# Altium footprint library PcbLib1.PcbLib: 48 footprints (part 2 of 3)
Each footprint in its own frame and in the unit in brackets; x right, y up, seen from the top. Pads: shape width x height; smd on the part's side, far side on the other; paste and mask are expansions set on the pad; w line width, h text height; cw(c..) or ccw(c..) is an arc to the next point about the centre after c.
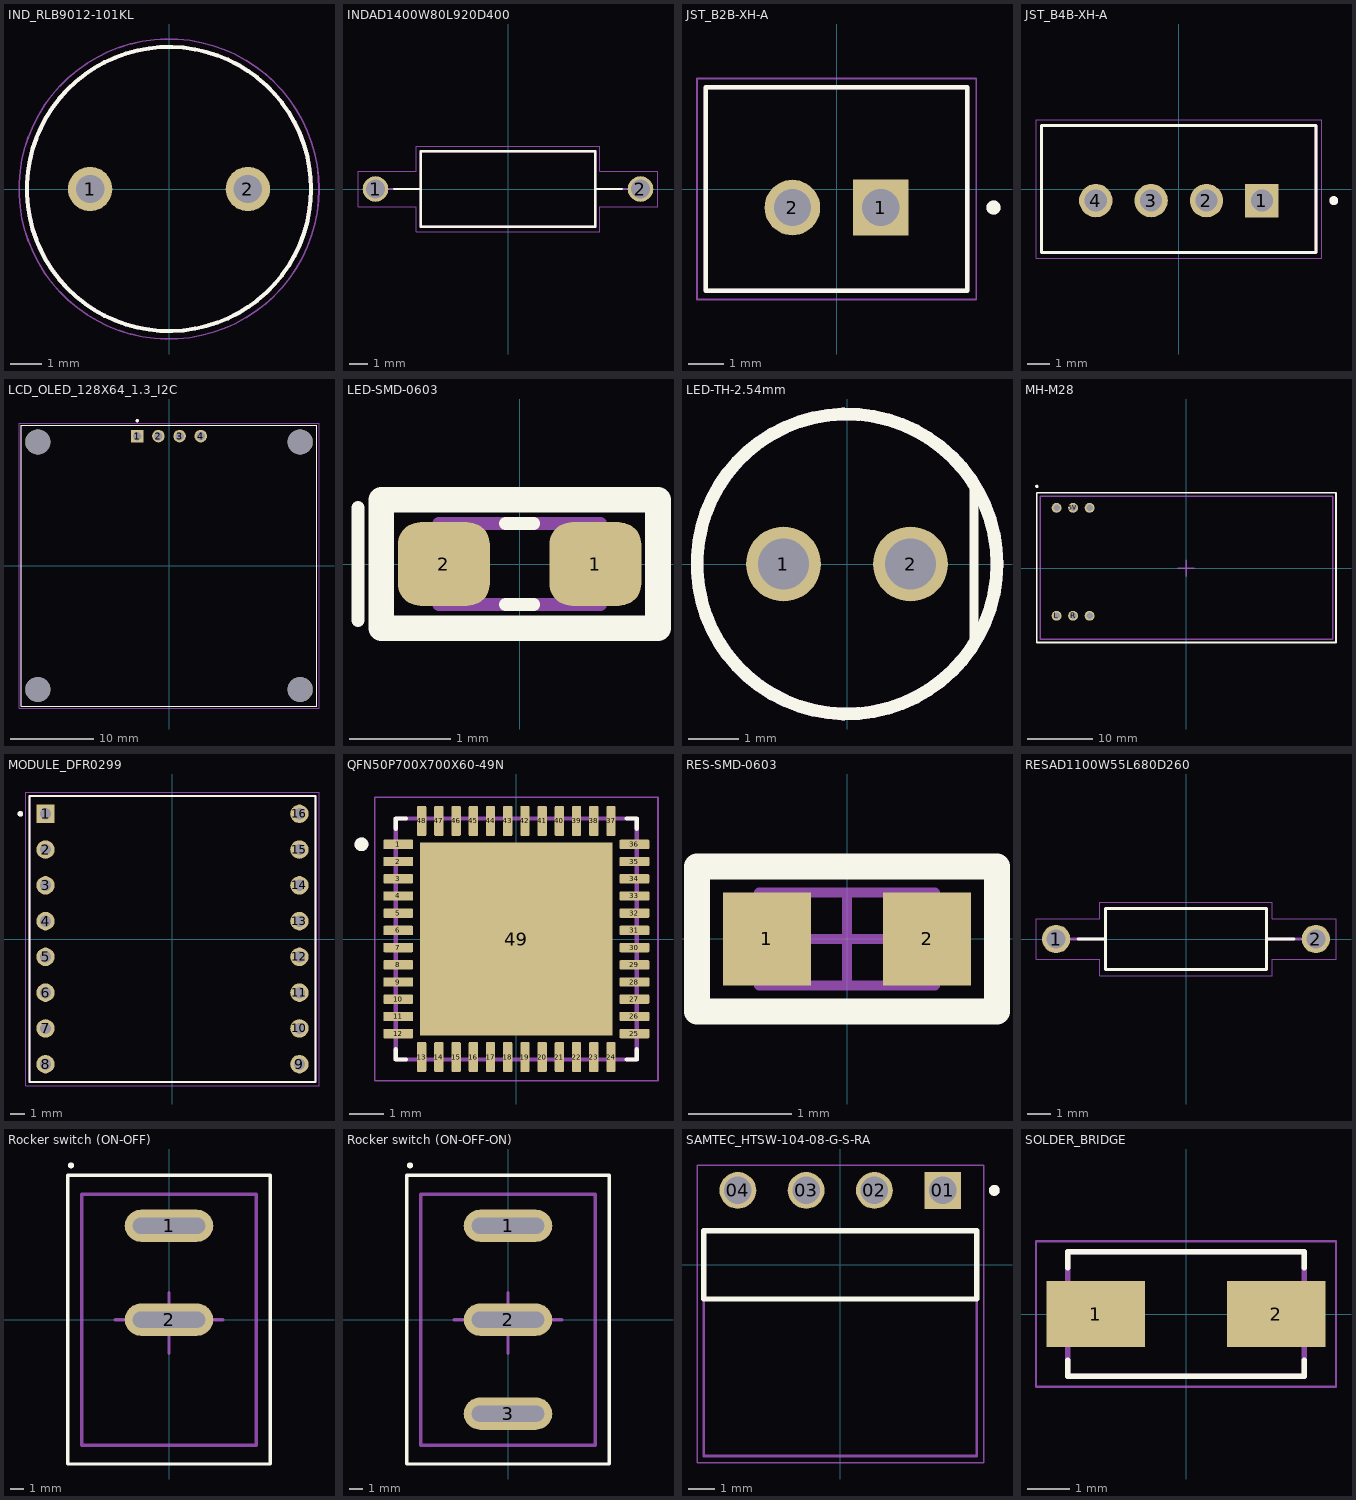
[diagram p1: the footprints below, top view; thin cyan lines are the x and y axes]

## IND_RLB9012-101KL [mm]
height 12.2
pads (2):
  round 1.408 hole 0.9: 1(-2.5,0) 2(2.5,0)
Top Overlay:
  circle w0.127: c0,0 r4.5
Mechanical 13:
  circle w0.127: c0,0 r4.5
Mechanical 15:
  circle w0.05: c0,0 r4.75
3D body "step_temp.STEP": height 12.2, standoff -30, extent -4.5,-4.5 4.5,4.5

## INDAD1400W80L920D400 [mm]
height 4
pads (2):
  round 1.35 hole 1: 1(-7,0) 2(7,0)
Top Overlay:
  lines w0.127: -6.005,0 -4.6,0 ; 4.6,0 6.005,0 ; -4.6,-2 4.6,-2 4.6,2 -4.6,2 -4.6,-2
Mechanical 13:
  lines w0.127: -7,0 -4.6,0 ; 4.6,0 7,0 ; -4.6,-2 -4.6,2 4.6,2 4.6,-2 -4.6,-2
Mechanical 15:
  lines w0.05: -7.925,-0.925 -7.925,0.925 -4.85,0.925 -4.85,2.25 4.85,2.25 4.85,0.925 7.925,0.925 7.925,-0.925 4.85,-0.925 4.85,-2.25 -4.85,-2.25 -4.85,-0.925 -7.925,-0.925
3D body "step_temp.STEP": height 4, standoff -21, extent -7.4,-2 7.4,2

## JST_B2B-XH-A [mm]
height 7
pads (2):
  rect 1.575x1.575 / inner round 1.575 / far side rect 1.575x1.575 hole 1.05: 1(1.25,-0.525)
  round 1.575 hole 1.05: 2(-1.25,-0.525)
Top Overlay:
  circle w0.2: c4.44,-0.525 r0.1
  lines w0.127: -3.7,-2.875 3.7,-2.875 3.7,2.875 -3.7,2.875 -3.7,-2.875
Mechanical 13:
  circle w0.2: c4.44,-0.525 r0.1
  lines w0.127: -3.7,-2.875 3.7,-2.875 3.7,2.875 -3.7,2.875 -3.7,-2.875
Mechanical 15:
  lines w0.05: -3.95,-3.125 -3.95,3.125 3.95,3.125 3.95,-3.125 -3.95,-3.125
3D body "B2B-XH-A--3DModel-STEP-56544.STEP": height 7, standoff -3.4, extent -3.717,-2.875 3.683,2.875

## JST_B4B-XH-A [mm]
height 7
pads (4):
  rect 1.508x1.508 / inner round 1.508 / far side rect 1.508x1.508 hole 1: 1(3.75,-0.525)
  round 1.508 hole 1: 2(1.25,-0.525) 3(-1.25,-0.525) 4(-3.75,-0.525)
Top Overlay:
  circle w0.2: c7,-0.525 r0.1
  lines w0.127: -6.2,-2.875 6.2,-2.875 6.2,2.875 -6.2,2.875 -6.2,-2.875
Mechanical 13:
  circle w0.2: c7,-0.525 r0.1
  lines w0.127: -6.2,-2.875 6.2,-2.875 6.2,2.875 -6.2,2.875 -6.2,-2.875
Mechanical 15:
  lines w0.05: -6.45,-3.125 6.45,-3.125 6.45,3.125 -6.45,3.125 -6.45,-3.125
3D body "step_temp.STEP": height 7, standoff -3.4, extent -6.2,-2.875 6.2,2.875

## LCD_OLED_128X64_1.3_I2C [mm]
pads (8):
  rect 1.508x1.508 / inner round 1.508 / far side rect 1.508x1.508 hole 1: 1(-3.81,15.55)
  round 1.508 hole 1: 2(-1.27,15.55) 3(1.27,15.55) 4(3.81,15.55)
  round 3 hole 3 unplated: ""(-15.75,-14.85) ""(-15.75,14.85) ""(15.75,-14.85) ""(15.75,14.85)
Top Overlay:
  circle w0.2: c-3.81,17.4 r0.1
  lines w0.127: -17.75,-16.85 -17.75,16.85 17.75,16.85 17.75,-16.85 -17.75,-16.85
Mechanical 13:
  circle w0.2: c-3.81,17.4 r0.1
  lines w0.127: -17.75,-16.85 -17.75,16.85 17.75,16.85 17.75,-16.85 -17.75,-16.85
Mechanical 15:
  lines w0.05: -18,-17.1 18,-17.1 18,17.1 -18,17.1 -18,-17.1
3D body "PCB v8.step": height 2, standoff -15.14, extent -17.747,-16.623 17.653,16.877

## LED-SMD-0603 [mm]
pads (2):
  rrect53% 0.91x0.83 smd: 1(0.75,0) 2(-0.75,0)
Top Overlay:
  lines w0.127: -1.6,-0.559 -1.6,0.559 ; -0.14,-0.4 0.14,-0.4 ; -0.14,0.4 0.14,0.4
  lines w0.254: -1.37,-0.635 1.37,-0.635 1.37,0.635 -1.37,0.635 -1.37,-0.635
Mechanical 13:
  lines w0.127: -0.8,-0.4 -0.8,0.4 0.8,0.4 0.8,-0.4 -0.8,-0.4
Mechanical 15:
  lines w0.05: -1.37,-0.67 -1.37,0.67 1.37,0.67 1.37,-0.67 -1.37,-0.67
3D body "step_temp.STEP": height 0.7, standoff 0, extent -0.8,-0.4 0.8,0.4

## LED-TH-2.54mm [mm]
pads (2):
  round 1.5 hole 1.02: 1(-1.27,0) 2(1.27,0)
Top Overlay:
  circle w0.254: c0,0 r3
  lines w0.178: 2.541,-1.595 2.541,1.608
Top Courtyard:
  circle w0.254: c0,0 r3
3D body "LED, 5mm, red v4.step": height 8.9, standoff -28, extent -2.938,-2.948 2.563,2.948

## MH-M28 [mm]
pads (6):
  round 1.524 hole 1: 5V(-17.42,9.3) AGND(-14.88,-7.3) GND(-19.96,9.3) L(-19.96,-7.3) R(-17.42,-7.3) VBAT(-14.88,9.3)
Top Overlay:
  circle w0.254: c-23,12.6 r0.127
  lines w0.254: -23,-11.4 23,-11.4 23,11.6 -23,11.6 -23,-11.4
Top Assembly:
  lines w0.254: -22.5,-10.9 -22.5,11.1 22.5,11.1 22.5,-10.9 -22.5,-10.9
Top Courtyard:
  lines w0.254: -1.3,0 1.2,0 ; 0,-1.2 0,1.2
3D body "mh-m28.STEP": height 5.96, standoff 0, extent -22.5,-11 22.5,11

## MODULE_DFR0299 [mm]
pads (16):
  rect 1.308x1.308 / inner round 1.308 / far side rect 1.308x1.308 hole 0.8: 1(-9.017,8.89)
  round 1.308 hole 0.8: 2(-9.017,6.35) 3(-9.017,3.81) 4(-9.017,1.27) 5(-9.017,-1.27) 6(-9.017,-3.81) 7(-9.017,-6.35) 8(-9.017,-8.89) 9(9.017,-8.89) 10(9.017,-6.35) 11(9.017,-3.81) 12(9.017,-1.27) 13(9.017,1.27) 14(9.017,3.81) 15(9.017,6.35) 16(9.017,8.89)
Top Overlay:
  circle w0.2: c-10.8,8.89 r0.1
  lines w0.127: -10.16,-10.16 10.16,-10.16 10.16,10.16 -10.16,10.16 -10.16,-10.16
Mechanical 13:
  circle w0.2: c-10.8,8.89 r0.1
  lines w0.127: -10.16,-10.16 -10.16,10.16 10.16,10.16 10.16,-10.16 -10.16,-10.16
Mechanical 15:
  lines w0.05: -10.41,-10.41 -10.41,10.41 10.41,10.41 10.41,-10.41 -10.41,-10.41
3D body "step_temp.STEP": height 6.25, standoff -5.5, extent -10.16,-10.16 10.16,10.16

## QFN50P700X700X60-49N [mm]
pads (49):
  rrect25% 0.87x0.27 smd: 1(-3.43,2.75) 2(-3.43,2.25) 3(-3.43,1.75) 4(-3.43,1.25) 5(-3.43,0.75) 6(-3.43,0.25) 7(-3.43,-0.25) 8(-3.43,-0.75) 9(-3.43,-1.25) 10(-3.43,-1.75) 11(-3.43,-2.25) 12(-3.43,-2.75) 25(3.43,-2.75) 26(3.43,-2.25) 27(3.43,-1.75) 28(3.43,-1.25) 29(3.43,-0.75) 30(3.43,-0.25) 31(3.43,0.25) 32(3.43,0.75) 33(3.43,1.25) 34(3.43,1.75) 35(3.43,2.25) 36(3.43,2.75)
  rrect25% 0.27x0.87 smd: 13(-2.75,-3.43) 14(-2.25,-3.43) 15(-1.75,-3.43) 16(-1.25,-3.43) 17(-0.75,-3.43) 18(-0.25,-3.43) 19(0.25,-3.43) 20(0.75,-3.43) 21(1.25,-3.43) 22(1.75,-3.43) 23(2.25,-3.43) 24(2.75,-3.43) 37(2.75,3.43) 38(2.25,3.43) 39(1.75,3.43) 40(1.25,3.43) 41(0.75,3.43) 42(0.25,3.43) 43(-0.25,3.43) 44(-0.75,3.43) 45(-1.25,3.43) 46(-1.75,3.43) 47(-2.25,3.43) 48(-2.75,3.43)
  rect 5.6x5.6 smd paste-4: 49(0,0)
Top Overlay:
  circle w0.2: c-4.5,2.75 r0.1
  lines w0.127: -3.5,-3.205 -3.5,-3.5 -3.205,-3.5 ; -3.5,3.205 -3.5,3.5 -3.205,3.5 ; 3.205,-3.5 3.5,-3.5 3.5,-3.205 ; 3.205,3.5 3.5,3.5 3.5,3.205
Top Paste:
  region: -0.51,0.51 -2.29,0.51 -2.29,2.29 -0.51,2.29
  region: 2.29,0.51 0.51,0.51 0.51,2.29 2.29,2.29
  region: -0.51,-2.29 -2.29,-2.29 -2.29,-0.51 -0.51,-0.51
  region: 2.29,-2.29 0.51,-2.29 0.51,-0.51 2.29,-0.51
Mechanical 13:
  circle w0.2: c-4.5,2.75 r0.1
  lines w0.127: -3.5,-3.5 3.5,-3.5 3.5,3.5 -3.5,3.5 -3.5,-3.5
Mechanical 15:
  lines w0.05: -4.115,-4.115 4.115,-4.115 4.115,4.115 -4.115,4.115 -4.115,-4.115
3D body "STM32F411CEU6--3DModel-STEP-56544.STEP": height 0.6, standoff 0, extent -3.5,-3.5 3.5,3.5

## RES-SMD-0603 [mm] "Chip Resistor, 2-Leads, Body 1.60x0.80mm, IPC Medium Density"
height 0.55
pads (2):
  rect 0.85x0.9 smd: 1(-0.775,0) 2(0.775,0)
Top Overlay:
  lines w0.254: -1.45,-0.7 1.45,-0.7 1.45,0.7 -1.45,0.7 -1.45,-0.7
Top Assembly:
  lines w0.1: -0.85,-0.45 -0.85,0.45 0.85,0.45 0.85,-0.45 -0.85,-0.45
Top Courtyard:
  lines w0.05: -1.45,-0.7 -1.45,0.7 1.45,0.7 1.45,-0.7 -1.45,-0.7
  lines w0.1: -0.45,0 0.45,0 ; 0,-0.45 0,0.45
3D body "RESC1608X06N.step": height 0.55, standoff 0, extent -0.85,-0.45 0.85,0.45

## RESAD1100W55L680D260 [mm]
height 2.6
pads (2):
  round 1.2 hole 0.8: 1(-5.5,0) 2(5.5,0)
Top Overlay:
  lines w0.127: -4.58,0 -3.4,0 ; 4.58,0 3.4,0 ; -3.4,0 -3.4,1.3 3.4,1.3 3.4,0 ; -3.4,0 -3.4,-1.3 3.4,-1.3 3.4,0
Mechanical 13:
  lines w0.127: -4.9,0 -3.4,0 ; 4.9,0 3.4,0 ; -3.4,0 -3.4,1.3 3.4,1.3 3.4,0 ; -3.4,0 -3.4,-1.3 3.4,-1.3 3.4,0
Mechanical 15:
  lines w0.05: -6.35,-0.85 -3.65,-0.85 -3.65,-1.55 3.65,-1.55 3.65,-0.85 6.35,-0.85 6.35,0.85 3.65,0.85 3.65,1.55 -3.65,1.55 -3.65,0.85 -6.35,0.85 -6.35,-0.85
3D body "step_temp.STEP": height 2.4, standoff -26.95, extent -5.775,-1.2 5.775,1.2

## Rocker switch (ON-OFF) [mm]
pads (2):
  oval 6.6x2.4 hole 1.2 slot 5.4 at 0 deg: 1(0,7) 2(0,0)
Top Overlay:
  circle w0.254: c-7.3,11.5 r0.1
  lines w0.254: -7.55,-10.75 -7.55,10.75 7.55,10.75 7.55,-10.75 -7.55,-10.75
Top Assembly:
  lines w0.254: -6.5,-9.35 -6.5,9.35 6.5,9.35 6.5,-9.35 -6.5,-9.35
Top Courtyard:
  lines w0.254: -4,0 4,0 ; 0,-2.5 0,2
3D body "RA1113112R.STEP": height 18.6, standoff -5.9, extent -7.6,-10.5 7.4,10.5

## Rocker switch (ON-OFF-ON) [mm]
pads (3):
  oval 6.6x2.4 hole 1.2 slot 5.4 at 0 deg: 1(0,7) 2(0,0) 3(0,-7)
Top Overlay:
  circle w0.254: c-7.3,11.5 r0.1
  lines w0.254: -7.55,-10.75 7.55,-10.75 7.55,10.75 -7.55,10.75 -7.55,-10.75
Top Assembly:
  lines w0.254: -6.5,-9.35 6.5,-9.35 6.5,9.35 -6.5,9.35 -6.5,-9.35
Top Courtyard:
  lines w0.254: -4,0 4,0 ; 0,-2.5 0,2
3D body "Rocker Switch - On-Off-On 05.step": height 15.41, standoff -6.5, extent -7.5,-10.958 7.5,10.958

## SAMTEC_HTSW-104-08-G-S-RA [mm]
pads (4):
  rect 1.37x1.37 / inner round 1.37 / far side rect 1.37x1.37 hole 1.02: 01(3.81,2.77)
  round 1.37 hole 1.02: 02(1.27,2.77) 03(-1.27,2.77) 04(-3.81,2.77)
Top Overlay:
  circle w0.2: c5.73,2.77 r0.1
  lines w0.2: -5.08,-1.27 5.08,-1.27 5.08,1.27 -5.08,1.27 -5.08,-1.27
Mechanical 13:
  circle w0.2: c5.73,2.77 r0.1
  lines w0.1: -5.08,-1.27 -5.08,-7.11 5.08,-7.11 5.08,-1.27 ; -5.08,-1.27 5.08,-1.27 ; -5.08,-1.27 -5.08,1.27 5.08,1.27 5.08,-1.27
Mechanical 15:
  lines w0.05: -5.33,-7.36 5.33,-7.36 5.33,3.705 -5.33,3.705 -5.33,-7.36
3D body "HTSW-104-08-G-S-RA.stp": height 2.52, standoff -2.81, extent -5.08,-7.082 5.08,3.141

## SOLDER_BRIDGE [mm]
height 2.7
pads (2):
  rect 2.33x1.56 smd paste+0 mask+0.102: 1(-2.14,0) 2(2.14,0)
Top Overlay:
  lines w0.127: -2.8,-1.1 -2.8,-1.475 2.8,-1.475 2.8,-1.1 ; -2.8,1.1 -2.8,1.475 2.8,1.475 2.8,1.1
Mechanical 13:
  lines w0.127: -2.8,-1.475 2.8,-1.475 2.8,1.475 -2.8,1.475 -2.8,-1.475
Mechanical 15:
  lines w0.05: -3.555,-1.725 -3.555,1.725 3.555,1.725 3.555,-1.725 -3.555,-1.725